# Altium schematic symbol library jlcpcb_2025_04_resistors_extended_1210.schlib: 2670 symbols (part 12 of 14) (continued)
## RS-1210K131JT
designator R?  Resistance: 130Ω  (hidden comment: *)
Resistor, 130Ω, ±5%, ±100ppm/℃, SMD 1210; Manufacturer: Uniroyal; Manufacturer Part Number: RS-1210K131JT; Supplier 1: LCSC; Supplier Part Number 1: C4354876; JLCPCB Part Number: C4354876; Category: Resistors; Package Size: 1210; JLCPCB Basic Part: Yes; Tolerance: ±5%; Temperature Coefficient: ±100ppm/℃; ComponentLink1Description: Datasheet; ComponentLink1URL: https://wmsc.lcsc.com/wmsc/upload/file/pdf/v2/lcsc/2207111830_FH--Guangdong-Fenghua-Advanced-Tech-RS-1210K131JT_C4354876.pdf; ComponentLink2Description: JLCPCB Part URL; ComponentLink2URL: https://jlcpcb.com/partdetail/C4354876
pins: 1, 2
1 alternate drawing of the same symbol

## RS-1210K152JT
designator R?  Resistance: 1.5kΩ  (hidden comment: *)
Resistor, 1.5kΩ, ±5%, 333.333mW, ±100ppm/℃, SMD 1210; Manufacturer: Uniroyal; Manufacturer Part Number: RS-1210K152JT; Supplier 1: LCSC; Supplier Part Number 1: C880411; JLCPCB Part Number: C880411; Power Rating: 333.333mW; Category: Resistors; Package Size: 1210; JLCPCB Basic Part: Yes; Tolerance: ±5%; Temperature Coefficient: ±100ppm/℃; ComponentLink1Description: Datasheet; ComponentLink1URL: https://wmsc.lcsc.com/wmsc/upload/file/pdf/v2/lcsc/2304140030_FH--Guangdong-Fenghua-Advanced-Tech-RS-1210K152JT_C880411.pdf; ComponentLink2Description: JLCPCB Part URL; ComponentLink2URL: https://jlcpcb.com/partdetail/C880411
pins: 1, 2
1 alternate drawing of the same symbol

## RS-1210K154JT
designator R?  Resistance: 150kΩ  (hidden comment: *)
Resistor, 150kΩ, ±5%, 333.333mW, 200V, ±100ppm/℃, -55℃~+155℃, SMD 1210; Manufacturer: Uniroyal; Manufacturer Part Number: RS-1210K154JT; Supplier 1: LCSC; Supplier Part Number 1: C341611; JLCPCB Part Number: C341611; Power Rating: 333.333mW; Category: Resistors; Package Size: 1210; JLCPCB Basic Part: Yes; Tolerance: ±5%; Voltage Rating: 200V; Temperature Coefficient: ±100ppm/℃; Temperature Rating: -55℃~+155℃; ComponentLink1Description: Datasheet; ComponentLink1URL: https://wmsc.lcsc.com/wmsc/upload/file/pdf/v2/lcsc/2304140030_FH--Guangdong-Fenghua-Advanced-Tech-RS-1210K154JT_C341611.pdf; ComponentLink2Description: JLCPCB Part URL; ComponentLink2URL: https://jlcpcb.com/partdetail/C341611
pins: 1, 2
1 alternate drawing of the same symbol

## RS-1210K180JT
designator R?  Resistance: 18Ω  (hidden comment: *)
Resistor, 18Ω, ±5%, 333.333mW, ±100ppm/℃, SMD 1210; Manufacturer: Uniroyal; Manufacturer Part Number: RS-1210K180JT; Supplier 1: LCSC; Supplier Part Number 1: C880291; JLCPCB Part Number: C880291; Power Rating: 333.333mW; Category: Resistors; Package Size: 1210; JLCPCB Basic Part: Yes; Tolerance: ±5%; Temperature Coefficient: ±100ppm/℃; ComponentLink1Description: Datasheet; ComponentLink1URL: https://wmsc.lcsc.com/wmsc/upload/file/pdf/v2/lcsc/2304140030_FH--Guangdong-Fenghua-Advanced-Tech-RS-1210K180JT_C880291.pdf; ComponentLink2Description: JLCPCB Part URL; ComponentLink2URL: https://jlcpcb.com/partdetail/C880291
pins: 1, 2
1 alternate drawing of the same symbol

## RS-1210K200JT
designator R?  Resistance: 20Ω  (hidden comment: *)
Resistor, 20Ω, ±5%, 333.333mW, 200V, ±100ppm/℃, -55℃~+155℃, SMD 1210; Manufacturer: Uniroyal; Manufacturer Part Number: RS-1210K200JT; Supplier 1: LCSC; Supplier Part Number 1: C341616; JLCPCB Part Number: C341616; Power Rating: 333.333mW; Category: Resistors; Package Size: 1210; JLCPCB Basic Part: Yes; Tolerance: ±5%; Voltage Rating: 200V; Temperature Coefficient: ±100ppm/℃; Temperature Rating: -55℃~+155℃; ComponentLink1Description: Datasheet; ComponentLink1URL: https://wmsc.lcsc.com/wmsc/upload/file/pdf/v2/lcsc/2304140030_FH--Guangdong-Fenghua-Advanced-Tech-RS-1210K200JT_C341616.pdf; ComponentLink2Description: JLCPCB Part URL; ComponentLink2URL: https://jlcpcb.com/partdetail/C341616
pins: 1, 2
1 alternate drawing of the same symbol

## RS-1210K202JT
designator R?  Resistance: 2kΩ  (hidden comment: *)
Resistor, 2kΩ, ±5%, 333.333mW, ±100ppm/℃, -55℃~+155℃, SMD 1210; Manufacturer: Uniroyal; Manufacturer Part Number: RS-1210K202JT; Supplier 1: LCSC; Supplier Part Number 1: C2961535; JLCPCB Part Number: C2961535; Power Rating: 333.333mW; Category: Resistors; Package Size: 1210; JLCPCB Basic Part: Yes; Tolerance: ±5%; Temperature Coefficient: ±100ppm/℃; Temperature Rating: -55℃~+155℃; ComponentLink1Description: Datasheet; ComponentLink1URL: https://wmsc.lcsc.com/wmsc/upload/file/pdf/v2/lcsc/2202211530_FH--Guangdong-Fenghua-Advanced-Tech-RS-1210K202JT_C2961535.pdf; ComponentLink2Description: JLCPCB Part URL; ComponentLink2URL: https://jlcpcb.com/partdetail/C2961535
pins: 1, 2
1 alternate drawing of the same symbol

## RS-1210K221JT
designator R?  Resistance: 220Ω  (hidden comment: *)
Resistor, 220Ω, ±5%, 333.333mW, ±100ppm/℃, SMD 1210; Manufacturer: Uniroyal; Manufacturer Part Number: RS-1210K221JT; Supplier 1: LCSC; Supplier Part Number 1: C784578; JLCPCB Part Number: C784578; Power Rating: 333.333mW; Category: Resistors; Package Size: 1210; JLCPCB Basic Part: Yes; Tolerance: ±5%; Temperature Coefficient: ±100ppm/℃; ComponentLink1Description: Datasheet; ComponentLink1URL: https://wmsc.lcsc.com/wmsc/upload/file/pdf/v2/lcsc/2009251935_FH--Guangdong-Fenghua-Advanced-Tech-RS-1210K221JT_C784578.pdf; ComponentLink2Description: JLCPCB Part URL; ComponentLink2URL: https://jlcpcb.com/partdetail/C784578
pins: 1, 2
1 alternate drawing of the same symbol

## RS-1210K222JT
designator R?  Resistance: 2.2kΩ  (hidden comment: *)
Resistor, 2.2kΩ, ±5%, 333.333mW, 200V, ±100ppm/℃, -55℃~+155℃, SMD 1210; Manufacturer: Uniroyal; Manufacturer Part Number: RS-1210K222JT; Supplier 1: LCSC; Supplier Part Number 1: C304942; JLCPCB Part Number: C304942; Power Rating: 333.333mW; Category: Resistors; Package Size: 1210; JLCPCB Basic Part: Yes; Tolerance: ±5%; Voltage Rating: 200V; Temperature Coefficient: ±100ppm/℃; Temperature Rating: -55℃~+155℃; ComponentLink1Description: Datasheet; ComponentLink1URL: https://wmsc.lcsc.com/wmsc/upload/file/pdf/v2/lcsc/2304140030_FH--Guangdong-Fenghua-Advanced-Tech-RS-1210K222JT_C304942.pdf; ComponentLink2Description: JLCPCB Part URL; ComponentLink2URL: https://jlcpcb.com/partdetail/C304942
pins: 1, 2
1 alternate drawing of the same symbol

## RS-1210K241JT
designator R?  Resistance: 240Ω  (hidden comment: *)
Resistor, 240Ω, ±5%, 333.333mW, ±100ppm/℃, SMD 1210; Manufacturer: Uniroyal; Manufacturer Part Number: RS-1210K241JT; Supplier 1: LCSC; Supplier Part Number 1: C880300; JLCPCB Part Number: C880300; Power Rating: 333.333mW; Category: Resistors; Package Size: 1210; JLCPCB Basic Part: Yes; Tolerance: ±5%; Temperature Coefficient: ±100ppm/℃; ComponentLink1Description: Datasheet; ComponentLink1URL: https://wmsc.lcsc.com/wmsc/upload/file/pdf/v2/lcsc/2304140030_FH--Guangdong-Fenghua-Advanced-Tech-RS-1210K241JT_C880300.pdf; ComponentLink2Description: JLCPCB Part URL; ComponentLink2URL: https://jlcpcb.com/partdetail/C880300
pins: 1, 2
1 alternate drawing of the same symbol

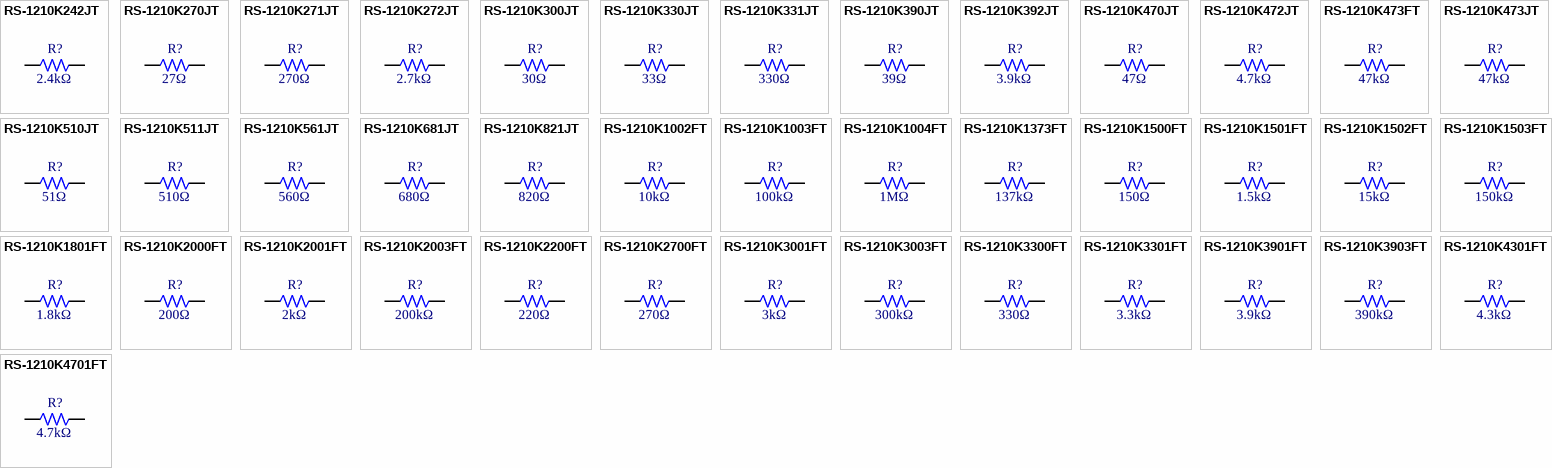
[diagram p55: symbols RS-1210K242JT to RS-1210K4701FT]

## RS-1210K242JT
designator R?  Resistance: 2.4kΩ  (hidden comment: *)
Resistor, 2.4kΩ, ±5%, 333.333mW, ±100ppm/℃, SMD 1210; Manufacturer: Uniroyal; Manufacturer Part Number: RS-1210K242JT; Supplier 1: LCSC; Supplier Part Number 1: C880378; JLCPCB Part Number: C880378; Power Rating: 333.333mW; Category: Resistors; Package Size: 1210; JLCPCB Basic Part: Yes; Tolerance: ±5%; Temperature Coefficient: ±100ppm/℃; ComponentLink1Description: Datasheet; ComponentLink1URL: https://wmsc.lcsc.com/wmsc/upload/file/pdf/v2/lcsc/2304140030_FH--Guangdong-Fenghua-Advanced-Tech-RS-1210K242JT_C880378.pdf; ComponentLink2Description: JLCPCB Part URL; ComponentLink2URL: https://jlcpcb.com/partdetail/C880378
pins: 1, 2
1 alternate drawing of the same symbol

## RS-1210K270JT
designator R?  Resistance: 27Ω  (hidden comment: *)
Resistor, 27Ω, ±5%, 333.333mW, ±100ppm/℃, SMD 1210; Manufacturer: Uniroyal; Manufacturer Part Number: RS-1210K270JT; Supplier 1: LCSC; Supplier Part Number 1: C880271; JLCPCB Part Number: C880271; Power Rating: 333.333mW; Category: Resistors; Package Size: 1210; JLCPCB Basic Part: Yes; Tolerance: ±5%; Temperature Coefficient: ±100ppm/℃; ComponentLink1Description: Datasheet; ComponentLink1URL: https://wmsc.lcsc.com/wmsc/upload/file/pdf/v2/lcsc/2304140030_FH--Guangdong-Fenghua-Advanced-Tech-RS-1210K270JT_C880271.pdf; ComponentLink2Description: JLCPCB Part URL; ComponentLink2URL: https://jlcpcb.com/partdetail/C880271
pins: 1, 2
1 alternate drawing of the same symbol

## RS-1210K271JT
designator R?  Resistance: 270Ω  (hidden comment: *)
Resistor, 270Ω, ±5%, 333.333mW, 200V, ±100ppm/℃, -55℃~+155℃, SMD 1210; Manufacturer: Uniroyal; Manufacturer Part Number: RS-1210K271JT; Supplier 1: LCSC; Supplier Part Number 1: C341619; JLCPCB Part Number: C341619; Power Rating: 333.333mW; Category: Resistors; Package Size: 1210; JLCPCB Basic Part: Yes; Tolerance: ±5%; Voltage Rating: 200V; Temperature Coefficient: ±100ppm/℃; Temperature Rating: -55℃~+155℃; ComponentLink1Description: Datasheet; ComponentLink1URL: https://wmsc.lcsc.com/wmsc/upload/file/pdf/v2/lcsc/2304140030_FH--Guangdong-Fenghua-Advanced-Tech-RS-1210K271JT_C341619.pdf; ComponentLink2Description: JLCPCB Part URL; ComponentLink2URL: https://jlcpcb.com/partdetail/C341619
pins: 1, 2
1 alternate drawing of the same symbol

## RS-1210K272JT
designator R?  Resistance: 2.7kΩ  (hidden comment: *)
Resistor, 2.7kΩ, ±5%, 333.333mW, 200V, ±100ppm/℃, -55℃~+155℃, SMD 1210; Manufacturer: Uniroyal; Manufacturer Part Number: RS-1210K272JT; Supplier 1: LCSC; Supplier Part Number 1: C294806; JLCPCB Part Number: C294806; Power Rating: 333.333mW; Category: Resistors; Package Size: 1210; JLCPCB Basic Part: Yes; Tolerance: ±5%; Voltage Rating: 200V; Temperature Coefficient: ±100ppm/℃; Temperature Rating: -55℃~+155℃; ComponentLink1Description: Datasheet; ComponentLink1URL: https://wmsc.lcsc.com/wmsc/upload/file/pdf/v2/lcsc/2304140030_FH--Guangdong-Fenghua-Advanced-Tech-RS-1210K272JT_C294806.pdf; ComponentLink2Description: JLCPCB Part URL; ComponentLink2URL: https://jlcpcb.com/partdetail/C294806
pins: 1, 2
1 alternate drawing of the same symbol

## RS-1210K300JT
designator R?  Resistance: 30Ω  (hidden comment: *)
Resistor, 30Ω, ±5%, 333.333mW, 200V, ±100ppm/℃, -55℃~+155℃, SMD 1210; Manufacturer: Uniroyal; Manufacturer Part Number: RS-1210K300JT; Supplier 1: LCSC; Supplier Part Number 1: C310375; JLCPCB Part Number: C310375; Power Rating: 333.333mW; Category: Resistors; Package Size: 1210; JLCPCB Basic Part: Yes; Tolerance: ±5%; Voltage Rating: 200V; Temperature Coefficient: ±100ppm/℃; Temperature Rating: -55℃~+155℃; ComponentLink1Description: Datasheet; ComponentLink1URL: https://wmsc.lcsc.com/wmsc/upload/file/pdf/v2/lcsc/2304140030_FH--Guangdong-Fenghua-Advanced-Tech-RS-1210K300JT_C310375.pdf; ComponentLink2Description: JLCPCB Part URL; ComponentLink2URL: https://jlcpcb.com/partdetail/C310375
pins: 1, 2
1 alternate drawing of the same symbol

## RS-1210K330JT
designator R?  Resistance: 33Ω  (hidden comment: *)
Resistor, 33Ω, ±5%, 333.333mW, ±100ppm/℃, SMD 1210; Manufacturer: Uniroyal; Manufacturer Part Number: RS-1210K330JT; Supplier 1: LCSC; Supplier Part Number 1: C962244; JLCPCB Part Number: C962244; Power Rating: 333.333mW; Category: Resistors; Package Size: 1210; JLCPCB Basic Part: Yes; Tolerance: ±5%; Temperature Coefficient: ±100ppm/℃; ComponentLink1Description: Datasheet; ComponentLink1URL: https://wmsc.lcsc.com/wmsc/upload/file/pdf/v2/lcsc/2304140030_FH--Guangdong-Fenghua-Advanced-Tech-RS-1210K330JT_C962244.pdf; ComponentLink2Description: JLCPCB Part URL; ComponentLink2URL: https://jlcpcb.com/partdetail/C962244
pins: 1, 2
1 alternate drawing of the same symbol

## RS-1210K331JT
designator R?  Resistance: 330Ω  (hidden comment: *)
Resistor, 330Ω, ±5%, 333.333mW, 200V, ±100ppm/℃, -55℃~+155℃, SMD 1210; Manufacturer: Uniroyal; Manufacturer Part Number: RS-1210K331JT; Supplier 1: LCSC; Supplier Part Number 1: C294807; JLCPCB Part Number: C294807; Power Rating: 333.333mW; Category: Resistors; Package Size: 1210; JLCPCB Basic Part: Yes; Tolerance: ±5%; Voltage Rating: 200V; Temperature Coefficient: ±100ppm/℃; Temperature Rating: -55℃~+155℃; ComponentLink1Description: Datasheet; ComponentLink1URL: https://wmsc.lcsc.com/wmsc/upload/file/pdf/v2/lcsc/2304140030_FH--Guangdong-Fenghua-Advanced-Tech-RS-1210K331JT_C294807.pdf; ComponentLink2Description: JLCPCB Part URL; ComponentLink2URL: https://jlcpcb.com/partdetail/C294807
pins: 1, 2
1 alternate drawing of the same symbol

## RS-1210K390JT
designator R?  Resistance: 39Ω  (hidden comment: *)
Resistor, 39Ω, ±5%, SMD 1210; Manufacturer: Uniroyal; Manufacturer Part Number: RS-1210K390JT; Supplier 1: LCSC; Supplier Part Number 1: C3036914; JLCPCB Part Number: C3036914; Category: Resistors; Package Size: 1210; JLCPCB Basic Part: Yes; Tolerance: ±5%; ComponentLink1Description: Datasheet; ComponentLink1URL: https://wmsc.lcsc.com/wmsc/upload/file/pdf/v2/lcsc/2206301715_FH--Guangdong-Fenghua-Advanced-Tech-RS-1210K390JT_C3036914.pdf; ComponentLink2Description: JLCPCB Part URL; ComponentLink2URL: https://jlcpcb.com/partdetail/C3036914
pins: 1, 2
1 alternate drawing of the same symbol

## RS-1210K392JT
designator R?  Resistance: 3.9kΩ  (hidden comment: *)
Resistor, 3.9kΩ, ±5%, 333.333mW, ±100ppm/℃, SMD 1210; Manufacturer: Uniroyal; Manufacturer Part Number: RS-1210K392JT; Supplier 1: LCSC; Supplier Part Number 1: C880296; JLCPCB Part Number: C880296; Power Rating: 333.333mW; Category: Resistors; Package Size: 1210; JLCPCB Basic Part: Yes; Tolerance: ±5%; Temperature Coefficient: ±100ppm/℃; ComponentLink1Description: Datasheet; ComponentLink1URL: https://wmsc.lcsc.com/wmsc/upload/file/pdf/v2/lcsc/2304140030_FH--Guangdong-Fenghua-Advanced-Tech-RS-1210K392JT_C880296.pdf; ComponentLink2Description: JLCPCB Part URL; ComponentLink2URL: https://jlcpcb.com/partdetail/C880296
pins: 1, 2
1 alternate drawing of the same symbol

## RS-1210K470JT
designator R?  Resistance: 47Ω  (hidden comment: *)
Resistor, 47Ω, ±5%, 333.333mW, 200V, ±100ppm/℃, -55℃~+155℃, SMD 1210; Manufacturer: Uniroyal; Manufacturer Part Number: RS-1210K470JT; Supplier 1: LCSC; Supplier Part Number 1: C310376; JLCPCB Part Number: C310376; Power Rating: 333.333mW; Category: Resistors; Package Size: 1210; JLCPCB Basic Part: Yes; Tolerance: ±5%; Voltage Rating: 200V; Temperature Coefficient: ±100ppm/℃; Temperature Rating: -55℃~+155℃; ComponentLink1Description: Datasheet; ComponentLink1URL: https://wmsc.lcsc.com/wmsc/upload/file/pdf/v2/lcsc/2304140030_FH--Guangdong-Fenghua-Advanced-Tech-RS-1210K470JT_C310376.pdf; ComponentLink2Description: JLCPCB Part URL; ComponentLink2URL: https://jlcpcb.com/partdetail/C310376
pins: 1, 2
1 alternate drawing of the same symbol

## RS-1210K472JT
designator R?  Resistance: 4.7kΩ  (hidden comment: *)
Resistor, 4.7kΩ, ±5%, 333.333mW, 200V, ±100ppm/℃, -55℃~+155℃, SMD 1210; Manufacturer: Uniroyal; Manufacturer Part Number: RS-1210K472JT; Supplier 1: LCSC; Supplier Part Number 1: C286690; JLCPCB Part Number: C286690; Power Rating: 333.333mW; Category: Resistors; Package Size: 1210; JLCPCB Basic Part: Yes; Tolerance: ±5%; Voltage Rating: 200V; Temperature Coefficient: ±100ppm/℃; Temperature Rating: -55℃~+155℃; ComponentLink1Description: Datasheet; ComponentLink1URL: https://wmsc.lcsc.com/wmsc/upload/file/pdf/v2/lcsc/2304140030_FH--Guangdong-Fenghua-Advanced-Tech-RS-1210K472JT_C286690.pdf; ComponentLink2Description: JLCPCB Part URL; ComponentLink2URL: https://jlcpcb.com/partdetail/C286690
pins: 1, 2
1 alternate drawing of the same symbol

## RS-1210K473FT
designator R?  Resistance: 47kΩ  (hidden comment: *)
Resistor, 47kΩ, ±1%, 333.333mW, 200V, ±100ppm/℃, -55℃~+155℃, SMD 1210; Manufacturer: Uniroyal; Manufacturer Part Number: RS-1210K473FT; Supplier 1: LCSC; Supplier Part Number 1: C304943; JLCPCB Part Number: C304943; Power Rating: 333.333mW; Category: Resistors; Package Size: 1210; JLCPCB Basic Part: Yes; Tolerance: ±1%; Voltage Rating: 200V; Temperature Coefficient: ±100ppm/℃; Temperature Rating: -55℃~+155℃; ComponentLink1Description: Datasheet; ComponentLink1URL: https://wmsc.lcsc.com/wmsc/upload/file/pdf/v2/lcsc/2304140030_FH--Guangdong-Fenghua-Advanced-Tech-RS-1210K473FT_C304943.pdf; ComponentLink2Description: JLCPCB Part URL; ComponentLink2URL: https://jlcpcb.com/partdetail/C304943
pins: 1, 2
1 alternate drawing of the same symbol

## RS-1210K473JT
designator R?  Resistance: 47kΩ  (hidden comment: *)
Resistor, 47kΩ, ±5%, 333.333mW, 200V, ±100ppm/℃, -55℃~+155℃, SMD 1210; Manufacturer: Uniroyal; Manufacturer Part Number: RS-1210K473JT; Supplier 1: LCSC; Supplier Part Number 1: C294808; JLCPCB Part Number: C294808; Power Rating: 333.333mW; Category: Resistors; Package Size: 1210; JLCPCB Basic Part: Yes; Tolerance: ±5%; Voltage Rating: 200V; Temperature Coefficient: ±100ppm/℃; Temperature Rating: -55℃~+155℃; ComponentLink1Description: Datasheet; ComponentLink1URL: https://wmsc.lcsc.com/wmsc/upload/file/pdf/v2/lcsc/2304140030_FH--Guangdong-Fenghua-Advanced-Tech-RS-1210K473JT_C294808.pdf; ComponentLink2Description: JLCPCB Part URL; ComponentLink2URL: https://jlcpcb.com/partdetail/C294808
pins: 1, 2
1 alternate drawing of the same symbol

## RS-1210K510JT
designator R?  Resistance: 51Ω  (hidden comment: *)
Resistor, 51Ω, ±5%, ±100ppm/℃, SMD 1210; Manufacturer: Uniroyal; Manufacturer Part Number: RS-1210K510JT; Supplier 1: LCSC; Supplier Part Number 1: C310377; JLCPCB Part Number: C310377; Category: Resistors; Package Size: 1210; JLCPCB Basic Part: Yes; Tolerance: ±5%; Temperature Coefficient: ±100ppm/℃; ComponentLink1Description: Datasheet; ComponentLink1URL: https://wmsc.lcsc.com/wmsc/upload/file/pdf/v2/lcsc/2202211530_FH--Guangdong-Fenghua-Advanced-Tech-RS-1210K510JT_C310377.pdf; ComponentLink2Description: JLCPCB Part URL; ComponentLink2URL: https://jlcpcb.com/partdetail/C310377
pins: 1, 2
1 alternate drawing of the same symbol

## RS-1210K511JT
designator R?  Resistance: 510Ω  (hidden comment: *)
Resistor, 510Ω, ±5%, 333.333mW, 200V, ±100ppm/℃, -55℃~+155℃, SMD 1210; Manufacturer: Uniroyal; Manufacturer Part Number: RS-1210K511JT; Supplier 1: LCSC; Supplier Part Number 1: C327445; JLCPCB Part Number: C327445; Power Rating: 333.333mW; Category: Resistors; Package Size: 1210; JLCPCB Basic Part: Yes; Tolerance: ±5%; Voltage Rating: 200V; Temperature Coefficient: ±100ppm/℃; Temperature Rating: -55℃~+155℃; ComponentLink1Description: Datasheet; ComponentLink1URL: https://wmsc.lcsc.com/wmsc/upload/file/pdf/v2/lcsc/2304140030_FH--Guangdong-Fenghua-Advanced-Tech-RS-1210K511JT_C327445.pdf; ComponentLink2Description: JLCPCB Part URL; ComponentLink2URL: https://jlcpcb.com/partdetail/C327445
pins: 1, 2
1 alternate drawing of the same symbol

## RS-1210K561JT
designator R?  Resistance: 560Ω  (hidden comment: *)
Resistor, 560Ω, ±5%, 333.333mW, ±100ppm/℃, SMD 1210; Manufacturer: Uniroyal; Manufacturer Part Number: RS-1210K561JT; Supplier 1: LCSC; Supplier Part Number 1: C880293; JLCPCB Part Number: C880293; Power Rating: 333.333mW; Category: Resistors; Package Size: 1210; JLCPCB Basic Part: Yes; Tolerance: ±5%; Temperature Coefficient: ±100ppm/℃; ComponentLink1Description: Datasheet; ComponentLink1URL: https://wmsc.lcsc.com/wmsc/upload/file/pdf/v2/lcsc/2304140030_FH--Guangdong-Fenghua-Advanced-Tech-RS-1210K561JT_C880293.pdf; ComponentLink2Description: JLCPCB Part URL; ComponentLink2URL: https://jlcpcb.com/partdetail/C880293
pins: 1, 2
1 alternate drawing of the same symbol

## RS-1210K681JT
designator R?  Resistance: 680Ω  (hidden comment: *)
Resistor, 680Ω, ±5%, 333.333mW, ±100ppm/℃, SMD 1210; Manufacturer: Uniroyal; Manufacturer Part Number: RS-1210K681JT; Supplier 1: LCSC; Supplier Part Number 1: C962150; JLCPCB Part Number: C962150; Power Rating: 333.333mW; Category: Resistors; Package Size: 1210; JLCPCB Basic Part: Yes; Tolerance: ±5%; Temperature Coefficient: ±100ppm/℃; ComponentLink1Description: Datasheet; ComponentLink1URL: https://wmsc.lcsc.com/wmsc/upload/file/pdf/v2/lcsc/2304140030_FH--Guangdong-Fenghua-Advanced-Tech-RS-1210K681JT_C962150.pdf; ComponentLink2Description: JLCPCB Part URL; ComponentLink2URL: https://jlcpcb.com/partdetail/C962150
pins: 1, 2
1 alternate drawing of the same symbol

## RS-1210K821JT
designator R?  Resistance: 820Ω  (hidden comment: *)
Resistor, 820Ω, ±5%, 333.333mW, 200V, ±100ppm/℃, -55℃~+155℃, SMD 1210; Manufacturer: Uniroyal; Manufacturer Part Number: RS-1210K821JT; Supplier 1: LCSC; Supplier Part Number 1: C507427; JLCPCB Part Number: C507427; Power Rating: 333.333mW; Category: Resistors; Package Size: 1210; JLCPCB Basic Part: Yes; Tolerance: ±5%; Voltage Rating: 200V; Temperature Coefficient: ±100ppm/℃; Temperature Rating: -55℃~+155℃; ComponentLink1Description: Datasheet; ComponentLink1URL: https://wmsc.lcsc.com/wmsc/upload/file/pdf/v2/lcsc/2304140030_FH--Guangdong-Fenghua-Advanced-Tech-RS-1210K821JT_C507427.pdf; ComponentLink2Description: JLCPCB Part URL; ComponentLink2URL: https://jlcpcb.com/partdetail/C507427
pins: 1, 2
1 alternate drawing of the same symbol

## RS-1210K1002FT
designator R?  Resistance: 10kΩ  (hidden comment: *)
Resistor, 10kΩ, ±1%, 333.333mW, 200V, ±100ppm/℃, -55℃~+155℃, SMD 1210; Manufacturer: Uniroyal; Manufacturer Part Number: RS-1210K1002FT; Supplier 1: LCSC; Supplier Part Number 1: C341605; JLCPCB Part Number: C341605; Power Rating: 333.333mW; Category: Resistors; Package Size: 1210; JLCPCB Basic Part: Yes; Tolerance: ±1%; Voltage Rating: 200V; Temperature Coefficient: ±100ppm/℃; Temperature Rating: -55℃~+155℃; ComponentLink1Description: Datasheet; ComponentLink1URL: https://wmsc.lcsc.com/wmsc/upload/file/pdf/v2/lcsc/2304140030_FH--Guangdong-Fenghua-Advanced-Tech-RS-1210K1002FT_C341605.pdf; ComponentLink2Description: JLCPCB Part URL; ComponentLink2URL: https://jlcpcb.com/partdetail/C341605
pins: 1, 2
1 alternate drawing of the same symbol

## RS-1210K1003FT
designator R?  Resistance: 100kΩ  (hidden comment: *)
Resistor, 100kΩ, ±1%, 333.333mW, 200V, ±100ppm/℃, -55℃~+155℃, SMD 1210; Manufacturer: Uniroyal; Manufacturer Part Number: RS-1210K1003FT; Supplier 1: LCSC; Supplier Part Number 1: C341606; JLCPCB Part Number: C341606; Power Rating: 333.333mW; Category: Resistors; Package Size: 1210; JLCPCB Basic Part: Yes; Tolerance: ±1%; Voltage Rating: 200V; Temperature Coefficient: ±100ppm/℃; Temperature Rating: -55℃~+155℃; ComponentLink1Description: Datasheet; ComponentLink1URL: https://wmsc.lcsc.com/wmsc/upload/file/pdf/v2/lcsc/2304140030_FH--Guangdong-Fenghua-Advanced-Tech-RS-1210K1003FT_C341606.pdf; ComponentLink2Description: JLCPCB Part URL; ComponentLink2URL: https://jlcpcb.com/partdetail/C341606
pins: 1, 2
1 alternate drawing of the same symbol

## RS-1210K1004FT
designator R?  Resistance: 1MΩ  (hidden comment: *)
Resistor, 1MΩ, ±1%, 333.333mW, 200V, ±100ppm/℃, -55℃~+155℃, SMD 1210; Manufacturer: Uniroyal; Manufacturer Part Number: RS-1210K1004FT; Supplier 1: LCSC; Supplier Part Number 1: C341607; JLCPCB Part Number: C341607; Power Rating: 333.333mW; Category: Resistors; Package Size: 1210; JLCPCB Basic Part: Yes; Tolerance: ±1%; Voltage Rating: 200V; Temperature Coefficient: ±100ppm/℃; Temperature Rating: -55℃~+155℃; ComponentLink1Description: Datasheet; ComponentLink1URL: https://wmsc.lcsc.com/wmsc/upload/file/pdf/v2/lcsc/2304140030_FH--Guangdong-Fenghua-Advanced-Tech-RS-1210K1004FT_C341607.pdf; ComponentLink2Description: JLCPCB Part URL; ComponentLink2URL: https://jlcpcb.com/partdetail/C341607
pins: 1, 2
1 alternate drawing of the same symbol

## RS-1210K1373FT
designator R?  Resistance: 137kΩ  (hidden comment: *)
Resistor, 137kΩ, ±1%, 333.333mW, 200V, ±100ppm/℃, -55℃~+155℃, SMD 1210; Manufacturer: Uniroyal; Manufacturer Part Number: RS-1210K1373FT; Supplier 1: LCSC; Supplier Part Number 1: C507078; JLCPCB Part Number: C507078; Power Rating: 333.333mW; Category: Resistors; Package Size: 1210; JLCPCB Basic Part: Yes; Tolerance: ±1%; Voltage Rating: 200V; Temperature Coefficient: ±100ppm/℃; Temperature Rating: -55℃~+155℃; ComponentLink1Description: Datasheet; ComponentLink1URL: https://wmsc.lcsc.com/wmsc/upload/file/pdf/v2/lcsc/2304140030_FH--Guangdong-Fenghua-Advanced-Tech-RS-1210K1373FT_C507078.pdf; ComponentLink2Description: JLCPCB Part URL; ComponentLink2URL: https://jlcpcb.com/partdetail/C507078
pins: 1, 2
1 alternate drawing of the same symbol

## RS-1210K1500FT
designator R?  Resistance: 150Ω  (hidden comment: *)
Resistor, 150Ω, ±1%, 333.333mW, 200V, ±100ppm/℃, -55℃~+155℃, SMD 1210; Manufacturer: Uniroyal; Manufacturer Part Number: RS-1210K1500FT; Supplier 1: LCSC; Supplier Part Number 1: C2838657; JLCPCB Part Number: C2838657; Power Rating: 333.333mW; Category: Resistors; Package Size: 1210; JLCPCB Basic Part: Yes; Tolerance: ±1%; Voltage Rating: 200V; Temperature Coefficient: ±100ppm/℃; Temperature Rating: -55℃~+155℃; ComponentLink1Description: Datasheet; ComponentLink1URL: https://wmsc.lcsc.com/wmsc/upload/file/pdf/v2/lcsc/2202131930_FH--Guangdong-Fenghua-Advanced-Tech-RS-1210K1500FT_C2838657.pdf; ComponentLink2Description: JLCPCB Part URL; ComponentLink2URL: https://jlcpcb.com/partdetail/C2838657
pins: 1, 2
1 alternate drawing of the same symbol

## RS-1210K1501FT
designator R?  Resistance: 1.5kΩ  (hidden comment: *)
Resistor, 1.5kΩ, ±1%, 333.333mW, ±100ppm/℃, SMD 1210; Manufacturer: Uniroyal; Manufacturer Part Number: RS-1210K1501FT; Supplier 1: LCSC; Supplier Part Number 1: C880431; JLCPCB Part Number: C880431; Power Rating: 333.333mW; Category: Resistors; Package Size: 1210; JLCPCB Basic Part: Yes; Tolerance: ±1%; Temperature Coefficient: ±100ppm/℃; ComponentLink1Description: Datasheet; ComponentLink1URL: https://wmsc.lcsc.com/wmsc/upload/file/pdf/v2/lcsc/2304140030_FH--Guangdong-Fenghua-Advanced-Tech-RS-1210K1501FT_C880431.pdf; ComponentLink2Description: JLCPCB Part URL; ComponentLink2URL: https://jlcpcb.com/partdetail/C880431
pins: 1, 2
1 alternate drawing of the same symbol

## RS-1210K1502FT
designator R?  Resistance: 15kΩ  (hidden comment: *)
Resistor, 15kΩ, ±1%, 333.333mW, ±100ppm/℃, -55℃~+155℃, SMD 1210; Manufacturer: Uniroyal; Manufacturer Part Number: RS-1210K1502FT; Supplier 1: LCSC; Supplier Part Number 1: C2939825; JLCPCB Part Number: C2939825; Power Rating: 333.333mW; Category: Resistors; Package Size: 1210; JLCPCB Basic Part: Yes; Tolerance: ±1%; Temperature Coefficient: ±100ppm/℃; Temperature Rating: -55℃~+155℃; ComponentLink1Description: Datasheet; ComponentLink1URL: https://wmsc.lcsc.com/wmsc/upload/file/pdf/v2/lcsc/2201121830_FH--Guangdong-Fenghua-Advanced-Tech-RS-1210K1502FT_C2939825.pdf; ComponentLink2Description: JLCPCB Part URL; ComponentLink2URL: https://jlcpcb.com/partdetail/C2939825
pins: 1, 2
1 alternate drawing of the same symbol

## RS-1210K1503FT
designator R?  Resistance: 150kΩ  (hidden comment: *)
Resistor, 150kΩ, ±1%, 333.333mW, 200V, ±100ppm/℃, -55℃~+155℃, SMD 1210; Manufacturer: Uniroyal; Manufacturer Part Number: RS-1210K1503FT; Supplier 1: LCSC; Supplier Part Number 1: C341609; JLCPCB Part Number: C341609; Power Rating: 333.333mW; Category: Resistors; Package Size: 1210; JLCPCB Basic Part: Yes; Tolerance: ±1%; Voltage Rating: 200V; Temperature Coefficient: ±100ppm/℃; Temperature Rating: -55℃~+155℃; ComponentLink1Description: Datasheet; ComponentLink1URL: https://wmsc.lcsc.com/wmsc/upload/file/pdf/v2/lcsc/2304140030_FH--Guangdong-Fenghua-Advanced-Tech-RS-1210K1503FT_C341609.pdf; ComponentLink2Description: JLCPCB Part URL; ComponentLink2URL: https://jlcpcb.com/partdetail/C341609
pins: 1, 2
1 alternate drawing of the same symbol

## RS-1210K1801FT
designator R?  Resistance: 1.8kΩ  (hidden comment: *)
Resistor, 1.8kΩ, ±1%, 333.333mW, 200V, ±100ppm/℃, -55℃~+155℃, SMD 1210; Manufacturer: Uniroyal; Manufacturer Part Number: RS-1210K1801FT; Supplier 1: LCSC; Supplier Part Number 1: C341612; JLCPCB Part Number: C341612; Power Rating: 333.333mW; Category: Resistors; Package Size: 1210; JLCPCB Basic Part: Yes; Tolerance: ±1%; Voltage Rating: 200V; Temperature Coefficient: ±100ppm/℃; Temperature Rating: -55℃~+155℃; ComponentLink1Description: Datasheet; ComponentLink1URL: https://wmsc.lcsc.com/wmsc/upload/file/pdf/v2/lcsc/2304140030_FH--Guangdong-Fenghua-Advanced-Tech-RS-1210K1801FT_C341612.pdf; ComponentLink2Description: JLCPCB Part URL; ComponentLink2URL: https://jlcpcb.com/partdetail/C341612
pins: 1, 2
1 alternate drawing of the same symbol

## RS-1210K2000FT
designator R?  Resistance: 200Ω  (hidden comment: *)
Resistor, 200Ω, ±1%, 333.333mW, 200V, ±100ppm/℃, -55℃~+155℃, SMD 1210; Manufacturer: Uniroyal; Manufacturer Part Number: RS-1210K2000FT; Supplier 1: LCSC; Supplier Part Number 1: C304941; JLCPCB Part Number: C304941; Power Rating: 333.333mW; Category: Resistors; Package Size: 1210; JLCPCB Basic Part: Yes; Tolerance: ±1%; Voltage Rating: 200V; Temperature Coefficient: ±100ppm/℃; Temperature Rating: -55℃~+155℃; ComponentLink1Description: Datasheet; ComponentLink1URL: https://wmsc.lcsc.com/wmsc/upload/file/pdf/v2/lcsc/2304140030_FH--Guangdong-Fenghua-Advanced-Tech-RS-1210K2000FT_C304941.pdf; ComponentLink2Description: JLCPCB Part URL; ComponentLink2URL: https://jlcpcb.com/partdetail/C304941
pins: 1, 2
1 alternate drawing of the same symbol

## RS-1210K2001FT
designator R?  Resistance: 2kΩ  (hidden comment: *)
Resistor, 2kΩ, ±1%, 333.333mW, ±100ppm/℃, SMD 1210; Manufacturer: Uniroyal; Manufacturer Part Number: RS-1210K2001FT; Supplier 1: LCSC; Supplier Part Number 1: C880406; JLCPCB Part Number: C880406; Power Rating: 333.333mW; Category: Resistors; Package Size: 1210; JLCPCB Basic Part: Yes; Tolerance: ±1%; Temperature Coefficient: ±100ppm/℃; ComponentLink1Description: Datasheet; ComponentLink1URL: https://wmsc.lcsc.com/wmsc/upload/file/pdf/v2/lcsc/2304140030_FH--Guangdong-Fenghua-Advanced-Tech-RS-1210K2001FT_C880406.pdf; ComponentLink2Description: JLCPCB Part URL; ComponentLink2URL: https://jlcpcb.com/partdetail/C880406
pins: 1, 2
1 alternate drawing of the same symbol

## RS-1210K2003FT
designator R?  Resistance: 200kΩ  (hidden comment: *)
Resistor, 200kΩ, ±1%, 333.333mW, ±100ppm/℃, SMD 1210; Manufacturer: Uniroyal; Manufacturer Part Number: RS-1210K2003FT; Supplier 1: LCSC; Supplier Part Number 1: C880266; JLCPCB Part Number: C880266; Power Rating: 333.333mW; Category: Resistors; Package Size: 1210; JLCPCB Basic Part: Yes; Tolerance: ±1%; Temperature Coefficient: ±100ppm/℃; ComponentLink1Description: Datasheet; ComponentLink1URL: https://wmsc.lcsc.com/wmsc/upload/file/pdf/v2/lcsc/2304140030_FH--Guangdong-Fenghua-Advanced-Tech-RS-1210K2003FT_C880266.pdf; ComponentLink2Description: JLCPCB Part URL; ComponentLink2URL: https://jlcpcb.com/partdetail/C880266
pins: 1, 2
1 alternate drawing of the same symbol

## RS-1210K2200FT
designator R?  Resistance: 220Ω  (hidden comment: *)
Resistor, 220Ω, ±1%, 333.333mW, ±100ppm/℃, -55℃~+155℃, SMD 1210; Manufacturer: Uniroyal; Manufacturer Part Number: RS-1210K2200FT; Supplier 1: LCSC; Supplier Part Number 1: C2961536; JLCPCB Part Number: C2961536; Power Rating: 333.333mW; Category: Resistors; Package Size: 1210; JLCPCB Basic Part: Yes; Tolerance: ±1%; Temperature Coefficient: ±100ppm/℃; Temperature Rating: -55℃~+155℃; ComponentLink1Description: Datasheet; ComponentLink1URL: https://wmsc.lcsc.com/wmsc/upload/file/pdf/v2/lcsc/2202211530_FH--Guangdong-Fenghua-Advanced-Tech-RS-1210K2200FT_C2961536.pdf; ComponentLink2Description: JLCPCB Part URL; ComponentLink2URL: https://jlcpcb.com/partdetail/C2961536
pins: 1, 2
1 alternate drawing of the same symbol

## RS-1210K2700FT
designator R?  Resistance: 270Ω  (hidden comment: *)
Resistor, 270Ω, ±1%, 333.333mW, ±100ppm/℃, SMD 1210; Manufacturer: Uniroyal; Manufacturer Part Number: RS-1210K2700FT; Supplier 1: LCSC; Supplier Part Number 1: C880318; JLCPCB Part Number: C880318; Power Rating: 333.333mW; Category: Resistors; Package Size: 1210; JLCPCB Basic Part: Yes; Tolerance: ±1%; Temperature Coefficient: ±100ppm/℃; ComponentLink1Description: Datasheet; ComponentLink1URL: https://wmsc.lcsc.com/wmsc/upload/file/pdf/v2/lcsc/2304140030_FH--Guangdong-Fenghua-Advanced-Tech-RS-1210K2700FT_C880318.pdf; ComponentLink2Description: JLCPCB Part URL; ComponentLink2URL: https://jlcpcb.com/partdetail/C880318
pins: 1, 2
1 alternate drawing of the same symbol

## RS-1210K3001FT
designator R?  Resistance: 3kΩ  (hidden comment: *)
Resistor, 3kΩ, ±1%, 333.333mW, ±100ppm/℃, -55℃~+155℃, SMD 1210; Manufacturer: Uniroyal; Manufacturer Part Number: RS-1210K3001FT; Supplier 1: LCSC; Supplier Part Number 1: C2939814; JLCPCB Part Number: C2939814; Power Rating: 333.333mW; Category: Resistors; Package Size: 1210; JLCPCB Basic Part: Yes; Tolerance: ±1%; Temperature Coefficient: ±100ppm/℃; Temperature Rating: -55℃~+155℃; ComponentLink1Description: Datasheet; ComponentLink1URL: https://wmsc.lcsc.com/wmsc/upload/file/pdf/v2/lcsc/2201121830_FH--Guangdong-Fenghua-Advanced-Tech-RS-1210K3001FT_C2939814.pdf; ComponentLink2Description: JLCPCB Part URL; ComponentLink2URL: https://jlcpcb.com/partdetail/C2939814
pins: 1, 2
1 alternate drawing of the same symbol

## RS-1210K3003FT
designator R?  Resistance: 300kΩ  (hidden comment: *)
Resistor, 300kΩ, ±1%, 333.333mW, 200V, ±100ppm/℃, -55℃~+155℃, SMD 1210; Manufacturer: Uniroyal; Manufacturer Part Number: RS-1210K3003FT; Supplier 1: LCSC; Supplier Part Number 1: C2840273; JLCPCB Part Number: C2840273; Power Rating: 333.333mW; Category: Resistors; Package Size: 1210; JLCPCB Basic Part: Yes; Tolerance: ±1%; Voltage Rating: 200V; Temperature Coefficient: ±100ppm/℃; Temperature Rating: -55℃~+155℃; ComponentLink1Description: Datasheet; ComponentLink1URL: https://wmsc.lcsc.com/wmsc/upload/file/pdf/v2/lcsc/2202132000_FH--Guangdong-Fenghua-Advanced-Tech-RS-1210K3003FT_C2840273.pdf; ComponentLink2Description: JLCPCB Part URL; ComponentLink2URL: https://jlcpcb.com/partdetail/C2840273
pins: 1, 2
1 alternate drawing of the same symbol

## RS-1210K3300FT
designator R?  Resistance: 330Ω  (hidden comment: *)
Resistor, 330Ω, ±1%, 333.333mW, ±100ppm/℃, SMD 1210; Manufacturer: Uniroyal; Manufacturer Part Number: RS-1210K3300FT; Supplier 1: LCSC; Supplier Part Number 1: C880407; JLCPCB Part Number: C880407; Power Rating: 333.333mW; Category: Resistors; Package Size: 1210; JLCPCB Basic Part: Yes; Tolerance: ±1%; Temperature Coefficient: ±100ppm/℃; ComponentLink1Description: Datasheet; ComponentLink1URL: https://wmsc.lcsc.com/wmsc/upload/file/pdf/v2/lcsc/2304140030_FH--Guangdong-Fenghua-Advanced-Tech-RS-1210K3300FT_C880407.pdf; ComponentLink2Description: JLCPCB Part URL; ComponentLink2URL: https://jlcpcb.com/partdetail/C880407
pins: 1, 2
1 alternate drawing of the same symbol

## RS-1210K3301FT
designator R?  Resistance: 3.3kΩ  (hidden comment: *)
Resistor, 3.3kΩ, ±1%, 333.333mW, ±100ppm/℃, SMD 1210; Manufacturer: Uniroyal; Manufacturer Part Number: RS-1210K3301FT; Supplier 1: LCSC; Supplier Part Number 1: C880391; JLCPCB Part Number: C880391; Power Rating: 333.333mW; Category: Resistors; Package Size: 1210; JLCPCB Basic Part: Yes; Tolerance: ±1%; Temperature Coefficient: ±100ppm/℃; ComponentLink1Description: Datasheet; ComponentLink1URL: https://wmsc.lcsc.com/wmsc/upload/file/pdf/v2/lcsc/2304140030_FH--Guangdong-Fenghua-Advanced-Tech-RS-1210K3301FT_C880391.pdf; ComponentLink2Description: JLCPCB Part URL; ComponentLink2URL: https://jlcpcb.com/partdetail/C880391
pins: 1, 2
1 alternate drawing of the same symbol

## RS-1210K3901FT
designator R?  Resistance: 3.9kΩ  (hidden comment: *)
Resistor, 3.9kΩ, ±1%, 333.333mW, ±100ppm/℃, SMD 1210; Manufacturer: Uniroyal; Manufacturer Part Number: RS-1210K3901FT; Supplier 1: LCSC; Supplier Part Number 1: C880320; JLCPCB Part Number: C880320; Power Rating: 333.333mW; Category: Resistors; Package Size: 1210; JLCPCB Basic Part: Yes; Tolerance: ±1%; Temperature Coefficient: ±100ppm/℃; ComponentLink1Description: Datasheet; ComponentLink1URL: https://wmsc.lcsc.com/wmsc/upload/file/pdf/v2/lcsc/2304140030_FH--Guangdong-Fenghua-Advanced-Tech-RS-1210K3901FT_C880320.pdf; ComponentLink2Description: JLCPCB Part URL; ComponentLink2URL: https://jlcpcb.com/partdetail/C880320
pins: 1, 2
1 alternate drawing of the same symbol

## RS-1210K3903FT
designator R?  Resistance: 390kΩ  (hidden comment: *)
Resistor, 390kΩ, ±1%, 333.333mW, 200V, ±100ppm/℃, -55℃~+155℃, SMD 1210; Manufacturer: Uniroyal; Manufacturer Part Number: RS-1210K3903FT; Supplier 1: LCSC; Supplier Part Number 1: C2840274; JLCPCB Part Number: C2840274; Power Rating: 333.333mW; Category: Resistors; Package Size: 1210; JLCPCB Basic Part: Yes; Tolerance: ±1%; Voltage Rating: 200V; Temperature Coefficient: ±100ppm/℃; Temperature Rating: -55℃~+155℃; ComponentLink1Description: Datasheet; ComponentLink1URL: https://wmsc.lcsc.com/wmsc/upload/file/pdf/v2/lcsc/2202132000_FH--Guangdong-Fenghua-Advanced-Tech-RS-1210K3903FT_C2840274.pdf; ComponentLink2Description: JLCPCB Part URL; ComponentLink2URL: https://jlcpcb.com/partdetail/C2840274
pins: 1, 2
1 alternate drawing of the same symbol

## RS-1210K4301FT
designator R?  Resistance: 4.3kΩ  (hidden comment: *)
Resistor, 4.3kΩ, ±1%, 333.333mW, 200V, ±100ppm/℃, -55℃~+155℃, SMD 1210; Manufacturer: Uniroyal; Manufacturer Part Number: RS-1210K4301FT; Supplier 1: LCSC; Supplier Part Number 1: C341621; JLCPCB Part Number: C341621; Power Rating: 333.333mW; Category: Resistors; Package Size: 1210; JLCPCB Basic Part: Yes; Tolerance: ±1%; Voltage Rating: 200V; Temperature Coefficient: ±100ppm/℃; Temperature Rating: -55℃~+155℃; ComponentLink1Description: Datasheet; ComponentLink1URL: https://wmsc.lcsc.com/wmsc/upload/file/pdf/v2/lcsc/2304140030_FH--Guangdong-Fenghua-Advanced-Tech-RS-1210K4301FT_C341621.pdf; ComponentLink2Description: JLCPCB Part URL; ComponentLink2URL: https://jlcpcb.com/partdetail/C341621
pins: 1, 2
1 alternate drawing of the same symbol

## RS-1210K4701FT
designator R?  Resistance: 4.7kΩ  (hidden comment: *)
Resistor, 4.7kΩ, ±1%, 250mW, 200V, ±100ppm/℃, SMD 1210; Manufacturer: Uniroyal; Manufacturer Part Number: RS-1210K4701FT; Supplier 1: LCSC; Supplier Part Number 1: C2936655; JLCPCB Part Number: C2936655; Power Rating: 250mW; Category: Resistors; Package Size: 1210; JLCPCB Basic Part: Yes; Tolerance: ±1%; Voltage Rating: 200V; Temperature Coefficient: ±100ppm/℃; ComponentLink1Description: Datasheet; ComponentLink1URL: https://wmsc.lcsc.com/wmsc/upload/file/pdf/v2/lcsc/2201121730_FH--Guangdong-Fenghua-Advanced-Tech-RS-1210K4701FT_C2936655.pdf; ComponentLink2Description: JLCPCB Part URL; ComponentLink2URL: https://jlcpcb.com/partdetail/C2936655
pins: 1, 2
1 alternate drawing of the same symbol
